# Altium footprint library LimeMicroAltiumLib_pcbLib.PcbLib: 223 footprints (part 10 of 15)
Each footprint in its own frame and in the unit in brackets; x right, y up, seen from the top. Pads: shape width x height; smd on the part's side, far side on the other; paste and mask are expansions set on the pad; w line width, h text height; cw(c..) or ccw(c..) is an arc to the next point about the centre after c.
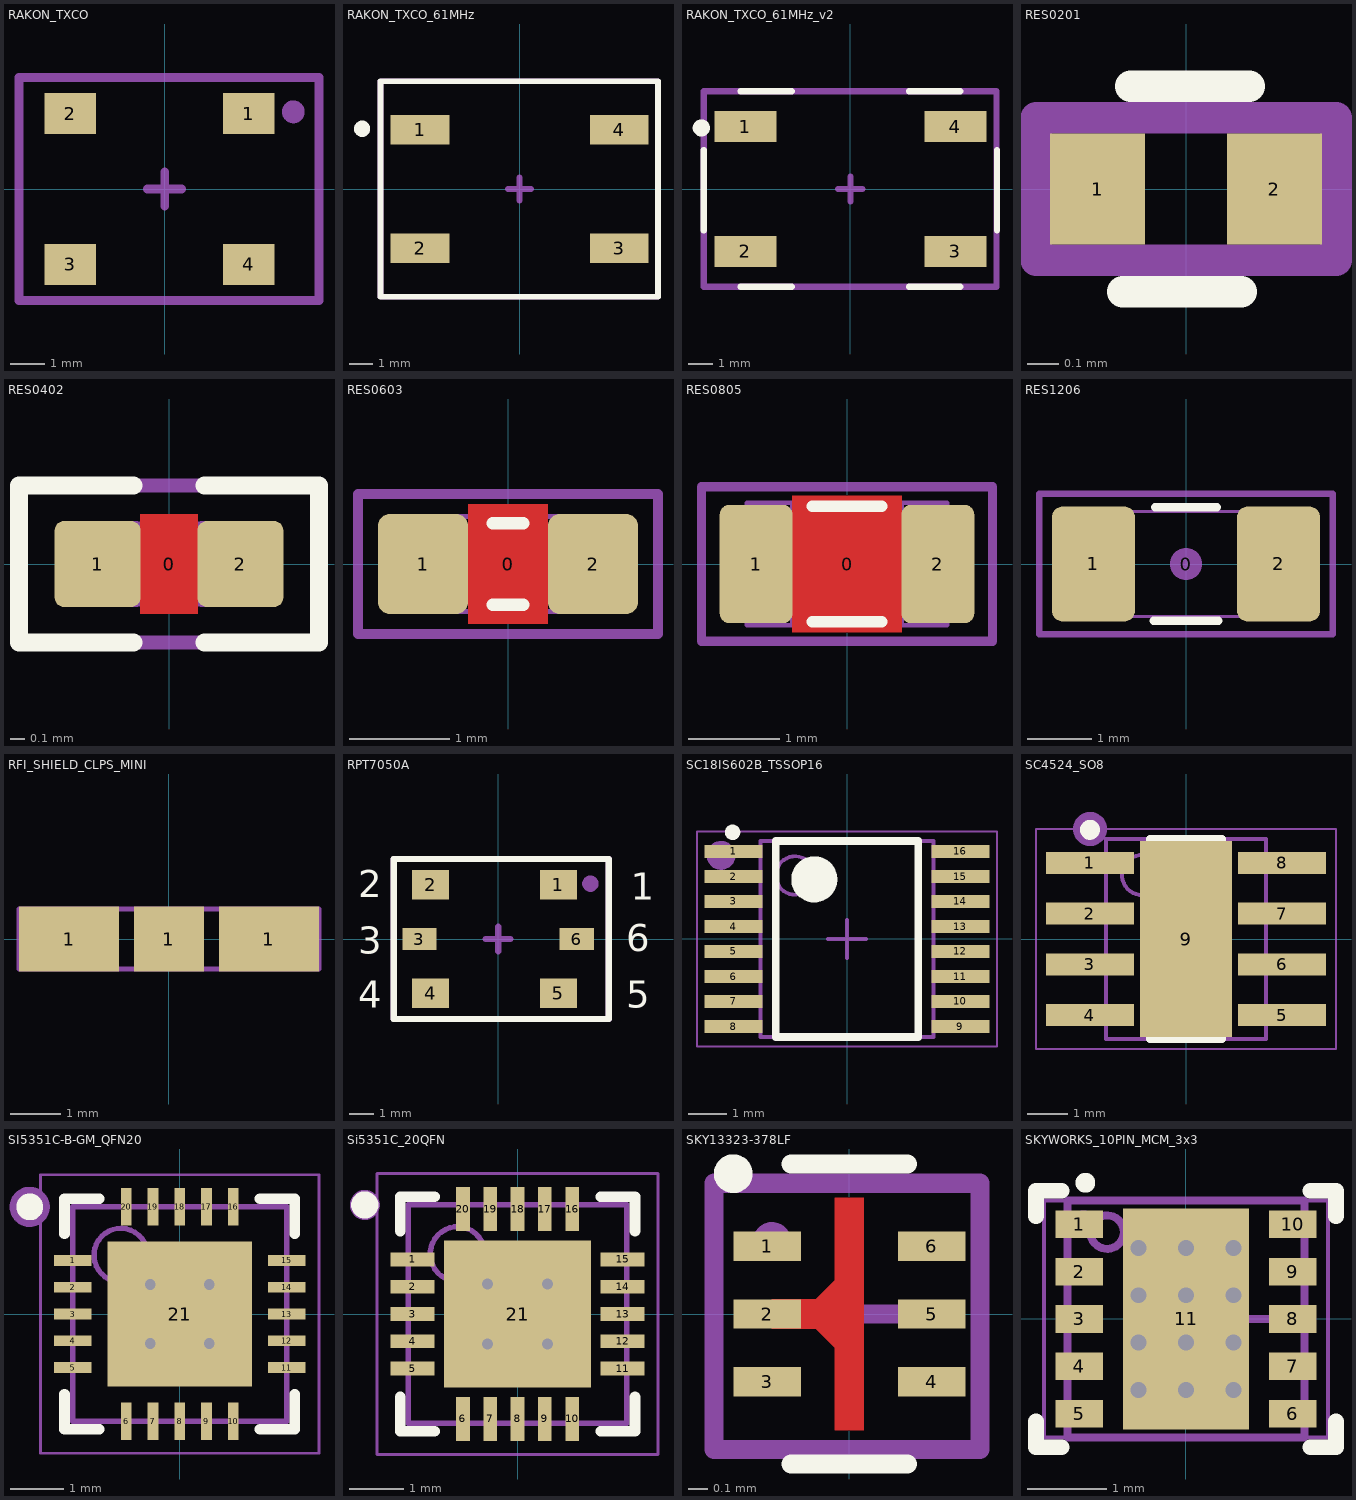
[diagram p9: the footprints below, top view; thin cyan lines are the x and y axes]

## RAKON_TXCO [mm] "30.72 MHz or 61.44 MHz"
pads (4):
  rect 1.5x1.2 smd: 1(2.45,2.2) 2(-2.75,2.2) 3(-2.75,-2.2) 4(2.45,-2.2)
Mechanical 15:
  circle w0.35: c3.75,2.25 r0.158
  lines w0.254: -0.5,0 0.5,0 ; 0,-0.5 0,0.5 ; -4.25,-3.25 4.5,-3.25 4.5,3.25 -4.25,3.25 -4.25,-3.25
  text ".Designator" at 0,0 h0.7
3D body "CAP 0402 (1005 metric).STEP": height 2.15, standoff 1.6, extent -0.825,-1.975 0.225,-1.425
3D body "CAP 0402 (1005 metric).STEP": height 2.15, standoff 1.6, extent 0.975,-1.975 2.025,-1.425
3D body "CAP 0402 (1005 metric).STEP": height 2.15, standoff 1.6, extent 2.125,0.775 2.675,1.825
3D body "CAP 0402 (1005 metric).STEP": height 2.15, standoff 1.6, extent 2.125,-1.025 2.675,0.025
3D body "Crystal TXC Corp 7M series.STEP": height 2.4, standoff 1.6, extent -2.95,-0.6 0.35,2
3D body "RES 0402 (1005 metric).STEP": height 2, standoff 1.6, extent -2.525,-1.975 -1.475,-1.425
3D body: height 1.6, standoff 0, extent -3.5,-2.3 3.2,2.3

## RAKON_TXCO_61MHz [mm] "61.44 MHz"
pads (4):
  rect 2.54x1.27 smd: 1(-4.3,2.55) 2(-4.3,-2.55) 3(4.3,-2.55) 4(4.3,2.55)
Top Overlay:
  circle w0.35: c-6.8,2.6 r0.177
  lines w0.254: -6,-4.65 5.975,-4.65 5.975,4.65 -6,4.65 -6,-4.65
Mechanical 15:
  circle w0.35: c-4.225,2.55 r0.158
  lines w0.254: -0.5,0 0.5,0 ; 0,-0.5 0,0.5 ; -6,-4.65 -6,4.65 5.975,4.65 5.975,-4.65 -6,-4.65
  text ".Designator" at 0,0 h0.7
3D body: height 0.1, standoff 0, extent -0.5,-4 0,-3.8
3D body: height 0.1, standoff 0, extent -5.8,2.5 -5.7,2.6

## RAKON_TXCO_61MHz_v2 [mm] "61.44 MHz"
pads (4):
  rect 2.54x1.27 smd: 1(-4.3,2.55) 2(-4.3,-2.55) 3(4.3,-2.55) 4(4.3,2.55)
Top Overlay:
  circle w0.35: c-6.1,2.5 r0.177
  lines w0.254: -6,-1.7 -6,1.6 ; -4.5,-4 -2.4,-4 ; -4.5,4 -2.4,4 ; 2.4,-4 4.5,-4 ; 2.4,4 4.5,4 ; 6,-1.7 6,1.6
Mechanical 15:
  circle w0.35: c-4.225,2.55 r0.158
  lines w0.254: -0.5,0 0.5,0 ; 0,-0.5 0,0.5 ; -6,-4 -6,4 5.975,4 5.975,-4 -6,-4
  text ".Designator" at 0,0 h0.7
3D body: height 0.1, standoff 0, extent -0.5,-4 0,-3.8
3D body: height 0.1, standoff 0, extent -5.8,2.5 -5.7,2.6

## RES0201 [mm]
pads (2):
  rect 0.3x0.35 smd: 1(-0.28,0) 2(0.28,0)
Top Overlay:
  lines w0.1: -0.2,-0.325 0.175,-0.325 ; -0.175,0.325 0.2,0.325
Mechanical 15:
  lines w0.1: -0.475,-0.225 0.475,-0.225 0.475,0.225 -0.475,0.225 -0.475,-0.225
  text ".Designator" at 0,0 h0.7
3D body: height 0.25, standoff 0, extent -0.17,-0.15 0.17,0.15
3D body: height 0.25, standoff 0, extent -0.3,-0.15 -0.17,0.15
3D body: height 0.25, standoff 0, extent 0.17,-0.15 0.3,0.15

## RES0402 [mm] "Chip Resistor, Body 1.0x0.5mm, EIA 0402, IPC Medium Density"
height 0.4
pads (3):
  round 0.2 on Mech15: 0(0,0)
  rrect20% 0.6x0.6 smd: 1(-0.5,0) 2(0.5,0)
Top Layer:
  pour cut-out: -0.2,0.35 0.2,0.35 0.2,-0.35 -0.2,-0.35
Top Overlay:
  lines w0.127: -0.25,-0.55 -1.05,-0.55 -1.05,0.55 -0.25,0.55 ; 0.25,-0.55 1.05,-0.55 1.05,0.55 0.25,0.55
Mechanical 13:
  lines w0.05: 0.225,-0.274 -0.225,-0.274 0.225,-0.274 ; -0.525,-0.275 -0.225,-0.275 -0.225,0.275 -0.525,0.275 -0.525,-0.275 ; -0.225,0.274 0.225,0.274 -0.225,0.274 ; 0.225,-0.275 0.225,0.275 0.525,0.275 0.525,-0.275 0.225,-0.275
Mechanical 15:
  lines w0.1: -1.05,-0.55 1.05,-0.55 1.05,0.55 -1.05,0.55 -1.05,-0.55
  text ".Designator" at 0,0 h0.7
3D body "RES 0402 (1005 metric).STEP": height 0.4, standoff 0, extent -0.525,-0.275 0.525,0.275

## RES0603 [mm] "Chip Resistor, Body 1.6x0.8mm, 0603, IPC Medium Density"
height 0.55
pads (3):
  round 0.254 on Mech15: 0(0,0)
  rrect25% 0.9x1 smd: 1(-0.85,0) 2(0.85,0)
Top Layer:
  pour cut-out: -0.4,0.6 0.4,0.6 0.4,-0.6 -0.4,-0.6
Top Overlay:
  lines w0.127: -0.152,-0.406 0.152,-0.406 ; -0.152,0.406 0.152,0.406
Mechanical 13:
  lines w0.05: -0.875,-0.475 -0.875,0.475 -0.475,0.475 -0.475,-0.475 -0.875,-0.475 ; -0.475,-0.474 0.475,-0.474 -0.475,-0.474 ; -0.475,0.474 0.475,0.474 -0.475,0.474 ; 0.475,-0.475 0.875,-0.475 0.875,0.475 0.475,0.475 0.475,-0.475
Mechanical 15:
  lines w0.1: -1.5,-0.7 1.5,-0.7 1.5,0.7 -1.5,0.7 -1.5,-0.7
  text ".Designator" at 0,0 h0.7
3D body "RES 0603 (1608 metric).STEP": height 0.54, standoff -0.01, extent -0.875,-0.475 0.875,0.475

## RES0805 [mm] "Chip Resistor, Body 2.0x1.2mm, 0805, IPC Medium Density"
height 0.7
pads (3):
  round 0.254 on Mech15: 0(0,0)
  rrect25% 0.8x1.3 smd: 1(-1,0) 2(1,0)
Top Layer:
  pour cut-out: -0.6,0.75 0.6,0.75 0.6,-0.75 -0.6,-0.75
Top Overlay:
  lines w0.127: -0.381,-0.635 0.381,-0.635 ; -0.381,0.635 0.381,0.635
Mechanical 13:
  lines w0.05: 0.6,-0.674 -0.6,-0.674 ; -0.6,-0.675 -0.6,0.675 -1.1,0.675 -1.1,-0.675 -0.6,-0.675 ; -0.6,-0.674 0.6,-0.674 ; 0.6,-0.675 0.6,0.675 ; 0.6,-0.675 1.1,-0.675 1.1,0.675 0.6,0.675 ; 0.6,0.674 -0.6,0.674 0.6,0.674
Mechanical 15:
  lines w0.1: -1.6,-0.85 1.6,-0.85 1.6,0.85 -1.6,0.85 -1.6,-0.85
  text ".Designator" at 0,0 h0.7
3D body "RES 0805 (2012 metric).STEP": height 0.69, standoff -0.01, extent -1.1,-0.675 1.1,0.675

## RES1206 [mm] "Chip Resistor, Body 3.2x1.6mm, 1206, IPC Medium Density"
height 0.7
pads (3):
  round 0.508 on Mech15: 0(0,0)
  rrect25% 1.3x1.8 smd: 1(-1.45,0) 2(1.45,0)
Top Overlay:
  lines w0.127: -0.508,-0.889 0.508,-0.889 ; -0.483,0.889 0.483,0.889
Mechanical 13:
  lines w0.05: 1.025,-0.824 -1.025,-0.824 1.025,-0.824 ; -1.625,-0.825 -1.625,0.825 -1.025,0.825 -1.025,-0.825 -1.625,-0.825 ; -1.025,0.824 1.025,0.824 -1.025,0.824 ; 1.025,-0.825 1.625,-0.825 1.625,0.825 1.025,0.825 1.025,-0.825
Mechanical 15:
  lines w0.1: -2.3,-1.1 2.3,-1.1 2.3,1.1 -2.3,1.1 -2.3,-1.1
  text ".Designator" at 0,0 h0.7
3D body "RES 1206 (3216 metric).STEP": height 0.69, standoff -0.01, extent -1.625,-0.825 1.625,0.825

## RFI_SHIELD_CLPS_MINI [mm] "RFI SHIELD CLIP MINI TIN SMD, S0971-46R"
pads (3):
  rect 2x1.3 smd mask+0.05: 1(-2,0) 1(2,0)
  rect 1.4x1.3 smd mask+0.05: 1(0,0)
Mechanical 15:
  lines w0.1: -0.2,0 0,0 ; 0,-0.2 0,0 ; 0,0.2 0,0 ; 0.2,0 0,0 ; -3,-0.6 3,-0.6 3,0.6 -3,0.6 -3,-0.6
  text ".Designator" at 0,0 h0.55
3D body: height 1, standoff 0, extent 0.7,-0.5 2.6,-0.4
3D body: height 1, standoff 0, extent 0.7,0.4 2.6,0.5
3D body: height 1, standoff 0, extent -2.6,0.4 -0.7,0.5
3D body: height 0.2, standoff 0, extent -2.9,-0.5 2.9,0.5
3D body: height 1, standoff 0, extent -2.6,-0.5 -0.7,-0.4

## RPT7050A [mm] "Rakon's Pluto+ ASIC"
pads (6):
  rect 1.5x1.2 smd: 1(2.45,2.2) 2(-2.75,2.2) 4(-2.75,-2.2) 5(2.45,-2.2)
  rect 1.4x0.9 smd: 3(-3.2,0) 6(3.2,0)
Top Overlay:
  lines w0.254: -4.25,-3.25 -4.25,3 -4.25,3.25 4.5,3.25 4.5,-3.25 -4.25,-3.25
  text "2" at -5.7,1.7 h1.1
  text "3" at -5.7,-0.6 h1.1
  text "4" at -5.7,-2.8 h1.1
  text "6" at 5.2,-0.5 h1.1
  text "5" at 5.2,-2.8 h1.1
  text "1" at 5.4,1.6 h1.1
Mechanical 15:
  circle w0.35: c3.75,2.25 r0.158
  lines w0.254: -0.5,0 0.5,0 ; 0,-0.5 0,0.5 ; -4.25,-3.25 4.5,-3.25 4.5,3.25 -4.25,3.25 -4.25,-3.25
  text ".Designator" at 0,0 h0.7

## SC18IS602B_TSSOP16 [mm]
pads (16):
  rect 1.5x0.35 smd: 1(-2.95,2.275) 2(-2.95,1.625) 3(-2.95,0.975) 4(-2.95,0.325) 5(-2.95,-0.325) 6(-2.95,-0.975) 7(-2.95,-1.625) 8(-2.95,-2.275) 9(2.95,-2.275) 10(2.95,-1.625) 11(2.95,-0.975) 12(2.95,-0.325) 13(2.95,0.325) 14(2.95,0.975) 15(2.95,1.625) 16(2.95,2.275)
Top Overlay:
  circle w0.25: c-2.975,2.775 r0.075
  circle w0.6: c-0.85,1.55 r0.3
  lines w0.2: -1.85,-2.55 -1.85,2.55 1.85,2.55 1.85,-2.55 -1.85,-2.55
Mechanical 13:
  circle w0.1: c-1.35,1.65 r0.5
  lines w0.1: -2.25,-2.55 -2.25,2.55 2.25,2.55 2.25,-2.55 -2.25,-2.55
Mechanical 15:
  circle w0.35: c-3.275,2.175 r0.2
  lines w0.05: -3.9,-2.8 -3.9,2.8 3.9,2.8 3.9,-2.8 -3.9,-2.8
  lines w0.1: -0.5,0 0.5,0 ; 0,-0.5 0,0.5
  text ".Designator" at 0,0 h0.7
3D body "User Library-TSSOP-16-1.step": height 1.1, standoff 0, extent -3.2,-2.5 3.2,2.5

## SC4524_SO8 [mm] "SOIC, 8-Leads, Body 4,90x3,90mm, Pitch 1,27mm, IPC Medium Density"
height 1.7
pads (9):
  rect 2.2x0.55 smd mask+0.05: 1(-2.4,1.905) 2(-2.4,0.635) 3(-2.4,-0.635) 4(-2.4,-1.905) 5(2.4,-1.905) 6(2.4,-0.635) 7(2.4,0.635) 8(2.4,1.905)
  rect 2.3x4.9 smd mask+0.05: 9(0,0)
Top Overlay:
  circle w0.25: c-2.4,2.73 r0.125
  lines w0.2: -0.9,-2.5 -0.9,2.5 0.9,2.5 0.9,-2.5 -0.9,-2.5
Mechanical 13:
  circle w0.1: c-1.1,1.6 r0.5
  lines w0.1: -2,-2.5 -2,2.5 2,2.5 2,-2.5 -2,-2.5
Mechanical 15:
  circle w0.35: c-2.4,2.75 r0.25
  lines w0.05: -3.75,-2.75 -3.75,2.75 3.75,2.75 3.75,-2.75 -3.75,-2.75
  lines w0.1: -0.5,0 0.5,0 ; 0,-0.5 0,0.5
  text ".Designator" at 0,-0.1 h0.7
3D body "CircuitWorks-SO-8.step": height 1.45, standoff 0, extent -2.9,-2.402 2.878,2.5

## SI5351C-B-GM_QFN20 [mm] "QFN, 20-Leads, Body 4,00x4,00mm, Pitch 0,50mm, Thermal Pad 2,70x2,70mm, IPC Medium Density"
height 0.85
pads (21):
  rect 0.7x0.2 smd: 1(-2,1) 2(-2,0.5) 3(-2,0) 4(-2,-0.5) 5(-2,-1) 11(2,-1) 12(2,-0.5) 13(2,0) 14(2,0.5) 15(2,1)
  rect 0.2x0.7 smd: 6(-1,-2) 7(-0.5,-2) 8(0,-2) 9(0.5,-2) 10(1,-2) 16(1,2) 17(0.5,2) 18(0,2) 19(-0.5,2) 20(-1,2)
  rect 2.7x2.7 smd: 21(0,0)
via -0.55,0.55 diameter 0.5 hole 0.2
via 0.55,0.55 diameter 0.5 hole 0.2
via -0.55,-0.55 diameter 0.5 hole 0.2
via 0.55,-0.55 diameter 0.5 hole 0.2
Top Overlay:
  circle w0.25: c-2.8,2 r0.125
  lines w0.2: -2.15,-1.5 -2.15,-2.15 -1.5,-2.15 ; -2.15,1.5 -2.15,2.15 -1.5,2.15 ; 1.5,-2.15 2.15,-2.15 2.15,-1.5 ; 1.5,2.15 2.15,2.15 2.15,1.5
Mechanical 13:
  circle w0.1: c-1.1,1.1 r0.5
  lines w0.1: -2,-2 -2,2 2,2 2,-2 -2,-2
Mechanical 15:
  circle w0.35: c-2.8,2 r0.2
  lines w0.05: -2.6,-2.6 -2.6,2.6 2.6,2.6 2.6,-2.6 -2.6,-2.6
  lines w0.1: -0.5,0 0.5,0 ; 0,-0.5 0,0.5
  text ".Designator" at 0,0 h0.7
3D body "User Library-QFN4x4_20pins.step": height 0.8, standoff 0, extent -2.02,-2.02 2.02,2.02

## Si5351C_20QFN [mm] "QFN, 20-Leads, Body 4,00x4,00mm, Pitch 0,50mm, Thermal Pad 2,70x2,70mm, IPC Medium Density"
height 0.8
pads (21):
  rect 0.8x0.25 smd mask+0.05: 1(-1.925,1) 2(-1.925,0.5) 3(-1.925,0) 4(-1.925,-0.5) 5(-1.925,-1) 11(1.925,-1) 12(1.925,-0.5) 13(1.925,0) 14(1.925,0.5) 15(1.925,1)
  rect 0.25x0.8 smd mask+0.05: 6(-1,-1.925) 7(-0.5,-1.925) 8(0,-1.925) 9(0.5,-1.925) 10(1,-1.925) 16(1,1.925) 17(0.5,1.925) 18(0,1.925) 19(-0.5,1.925) 20(-1,1.925)
  rect 2.7x2.7 smd mask+0.05: 21(0,0)
via 0.55,-0.55 diameter 0.4 hole 0.2
via -0.55,-0.55 diameter 0.4 hole 0.2
via 0.55,0.55 diameter 0.4 hole 0.2
via -0.55,0.55 diameter 0.4 hole 0.2
Top Overlay:
  circle w0.25: c-2.8,2 r0.125
  lines w0.2: -2.15,-1.525 -2.15,-2.15 -1.525,-2.15 ; -2.15,1.525 -2.15,2.15 -1.525,2.15 ; 1.525,-2.15 2.15,-2.15 2.15,-1.525 ; 1.525,2.15 2.15,2.15 2.15,1.525
Mechanical 13:
  circle w0.1: c-1.1,1.1 r0.5
  lines w0.1: -2,-2 2,-2 2,2 -2,2 -2,-2
Mechanical 15:
  circle w0.35: c-2.8,2 r0.1
  lines w0.05: -2.575,-2.575 2.575,-2.575 2.575,2.575 -2.575,2.575 -2.575,-2.575
  lines w0.1: -0.5,0 0.5,0 ; 0,-0.5 0,0.5
  text ".Designator" at 0,0 h0.7
3D body "User Library-QFN4x4_20pins.step": height 0.8, standoff 0, extent -2.02,-2.02 2.02,2.02

## SKY13323-378LF [mm] "SKY13323-378LF RF switch"
pads (6):
  rect 0.35x0.15 smd mask+0.05: 1(-0.425,0.35) 2(-0.425,0) 3(-0.425,-0.35) 4(0.425,-0.35) 5(0.425,0) 6(0.425,0.35)
Top Layer:
  region: -0.4,-0.075 -0.175,-0.075 -0.075,-0.175 -0.075,-0.6 0.075,-0.6 0.075,0 -0.4,0
  region: -0.4,0.075 -0.175,0.075 -0.075,0.175 -0.075,0.6 0.075,0.6 0.075,0 -0.4,0
Top Overlay:
  circle w0.1: c-0.6,0.725 r0.05
  lines w0.1: -0.3,-0.775 0.3,-0.775 ; -0.3,0.775 0.3,0.775
Top Paste:
  region: -0.05,0.575 0.05,0.575 0.05,0.1 -0.05,0.1
  region: -0.05,-0.575 0.05,-0.575 0.05,-0.1 -0.05,-0.1
Mechanical 15:
  circle w0.1: c-0.4,0.375 r0.05
  lines w0.1: -0.25,0 0,0 ; 0,-0.25 0,0 ; 0,0.25 0,0 ; 0.25,0 0,0 ; -0.7,-0.7 -0.7,0.675 0.675,0.675 0.675,-0.7 -0.7,-0.7
  text ".Designator" at 0,0 h0.55
3D body: height 0.51, standoff 0.5, extent -0.425,0.225 -0.225,0.425
3D body: height 0.5, standoff 0, extent -0.5,-0.5 0.5,0.5

## SKYWORKS_10PIN_MCM_3x3 [mm]
height 0.8
pads (11):
  rect 0.6x0.35 smd: 1(-1.35,1.2) 2(-1.35,0.6) 3(-1.35,0) 4(-1.35,-0.6) 5(-1.35,-1.2) 6(1.35,-1.2) 7(1.35,-0.6) 8(1.35,0) 9(1.35,0.6) 10(1.35,1.2)
  rect 1.6x2.8 smd mask+0.05: 11(0,0)
via -0.6,-0.9 diameter 0.4 hole 0.2
via 0,-0.9 diameter 0.4 hole 0.2
via 0.6,-0.9 diameter 0.4 hole 0.2
via -0.6,-0.3 diameter 0.4 hole 0.2
via 0.6,-0.3 diameter 0.4 hole 0.2
via 0,-0.3 diameter 0.4 hole 0.2
via -0.6,0.3 diameter 0.4 hole 0.2
via 0,0.3 diameter 0.4 hole 0.2
via 0.6,0.3 diameter 0.4 hole 0.2
via -0.6,0.9 diameter 0.4 hole 0.2
via 0,0.9 diameter 0.4 hole 0.2
via 0.6,0.9 diameter 0.4 hole 0.2
Top Overlay:
  circle w0.2: c-1.275,1.725 r0.025
  lines w0.2: -1.9,-1.3 -1.9,-1.625 -1.575,-1.625 ; -1.9,1.3 -1.9,1.625 -1.575,1.625 ; 1.575,-1.625 1.9,-1.625 1.9,-1.3 ; 1.575,1.625 1.9,1.625 1.9,1.3
Mechanical 13:
  circle w0.1: c-1,1.1 r0.212
  lines w0.1: -1.5,-1.5 1.5,-1.5 1.5,1.5 -1.5,1.5 -1.5,-1.5
Mechanical 15:
  circle w0.35: c-1.3,1.2 r0
  lines w0.05: -1.8,-1.5 1.8,-1.5 1.8,1.5 -1.8,1.5 -1.8,-1.5
  lines w0.1: 0.1,0 1.1,0 ; 0.6,-0.5 0.6,0.5
  text ".Designator" at 0,0 h0.7
3D body: height 0.9, standoff 0, extent -1.5,-1.5 1.5,1.5